# Altium footprint library WL_RFFC.PcbLib: 42 footprints (part 2 of 3)
Each footprint in its own frame and in the unit in brackets; x right, y up, seen from the top. Pads: shape width x height; smd on the part's side, far side on the other; paste and mask are expansions set on the pad; w line width, h text height; cw(c..) or ccw(c..) is an arc to the next point about the centre after c.
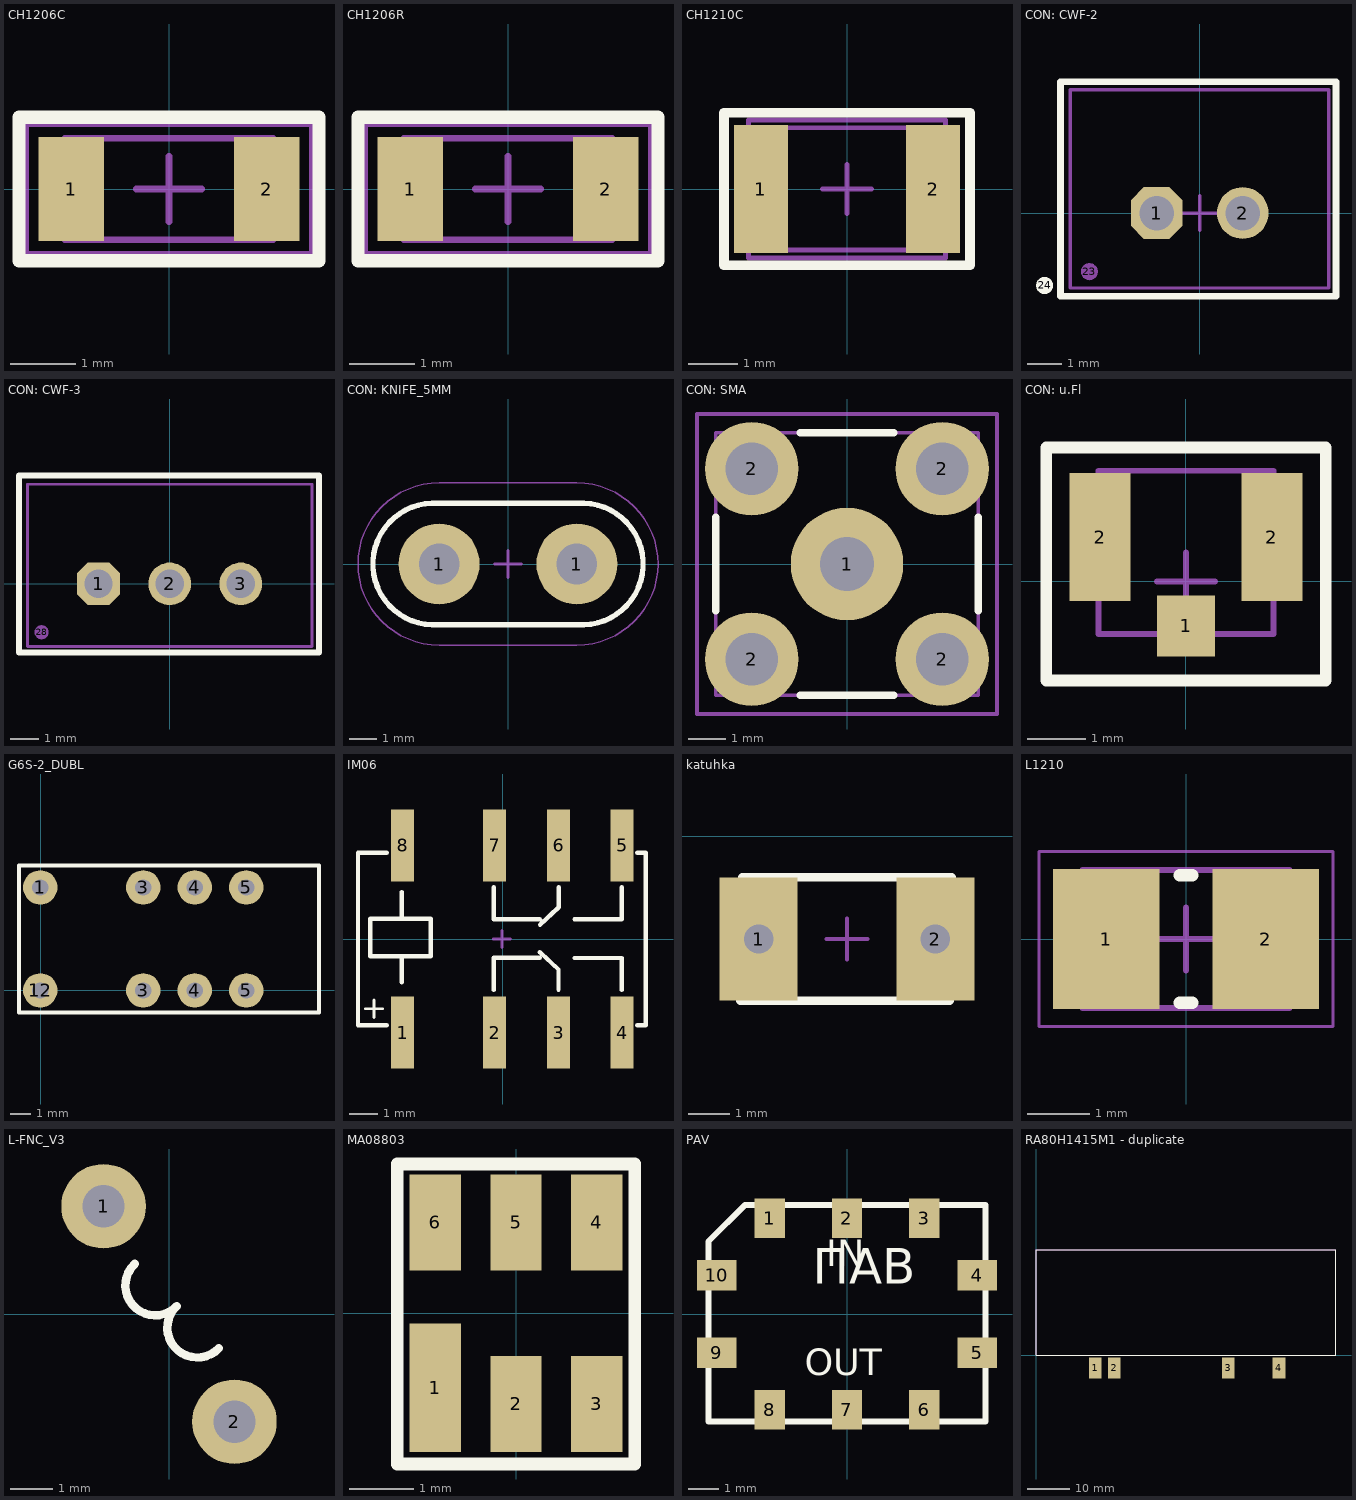
[diagram p1: the footprints below, top view; thin cyan lines are the x and y axes]

## CH1206C [mm] "Non polar chip capacitor, size 1206"
height 0.6
pads (2):
  rect 1x1.6 smd: 1(-1.5,0) 2(1.5,0)
Top Overlay:
  lines w0.2: -2.3,-1.1 -2.3,1.1 2.3,1.1 2.3,-1.1 -2.3,-1.1
Mechanical 1:
  lines w0.1: -1.6,-0.775 -1.6,0.775 1.6,0.775 1.6,-0.775 -1.6,-0.775
Mechanical 15:
  lines w0.1: -0.5,0 0.5,0 ; 0,-0.5 0,0.5 ; -2.2,-1 2.2,-1 2.2,1 -2.2,1 -2.2,-1
3D body "SW3dPS-1206 SMD Capacitor.STEP": height 1, standoff 0, extent -1.6,-0.8 1.6,0.8

## CH1206R [mm] "Chip Resistor, 2-Leads, Body 3,0x1,5mm, IPC Low Density"
height 0.6
pads (2):
  rect 1x1.6 smd: 1(-1.5,0) 2(1.5,0)
Top Overlay:
  lines w0.2: -2.3,-1.1 -2.3,1.1 2.3,1.1 2.3,-1.1 -2.3,-1.1
Mechanical 1:
  lines w0.1: -1.6,-0.775 -1.6,0.775 1.6,0.775 1.6,-0.775 -1.6,-0.775
Mechanical 15:
  lines w0.1: -0.5,0 0.5,0 ; 0,-0.5 0,0.5 ; -2.2,-1 2.2,-1 2.2,1 -2.2,1 -2.2,-1
3D body "chip_1206_r.STEP": height 0.47, standoff -0.03, extent -1.65,-0.8 1.55,0.8

## CH1210C [mm] "Non polar chip capacitor, size 1210"
height 2.5
pads (2):
  rect 1.1x2.6 smd: 1(-1.75,0) 2(1.75,0)
Top Overlay:
  lines w0.2: -2.5,-1.55 -2.5,1.55 2.5,1.55 2.5,-1.55 -2.5,-1.55
Mechanical 1:
  lines w0.1: -2,-1.244 2,-1.244 2,1.245 -2,1.245 -2,-1.244
Mechanical 15:
  lines w0.1: -0.5,0 0.5,0 ; 0,-0.5 0,0.5 ; -2,-1.4 -2,1.4 2,1.4 2,-1.4 -2,-1.4
3D body "User Library-1210(3225M) Cap.STEP": height 1.7, standoff 0, extent -2,-1.244 2,1.245

## CON: CWF-2 [mm]
height 7.7
pads (4):
  oct 1.5x1.5 hole 1: 1(-1.25,0)
  round 1.5 hole 1: 2(1.25,0)
  round 0.5 on Mech1: 23(-3.2,-1.7)
  round 0.5 on Top Overlay: 24(-4.5,-2.1)
Top Overlay:
  lines w0.2: -4.044,-2.413 -4.044,3.81 3.957,3.81 3.957,-2.413 -4.044,-2.413
Mechanical 1:
  lines w0.1: -3.75,-2.175 3.75,-2.175 3.75,3.575 -3.75,3.575 -3.75,-2.175
Mechanical 15:
  lines w0.1: -0.5,0 0.5,0 ; 0,-0.5 0,0.5 ; -4.044,-2.413 -4.044,3.81 3.957,3.81 3.957,-2.413 -4.044,-2.413
3D body "CWF-2.step": height 7, standoff -3.5, extent -3.75,-2.175 3.75,3.575

## CON: CWF-3 [mm]
height 7.7
pads (4):
  oct 1.5x1.5 hole 1: 1(-2.5,0)
  round 1.5 hole 1: 2(0,0) 3(2.5,0)
  round 0.5 on Mech1: 28(-4.5,-1.7)
Top Overlay:
  lines w0.2: -5.294,-2.413 5.247,-2.413 5.247,3.81 -5.294,3.81 -5.294,-2.413
Mechanical 1:
  lines w0.1: -5,-2.2 -5,3.5 5,3.5 5,-2.2 -5,-2.2
Mechanical 15:
  lines w0.1: -0.5,0 0.5,0 ; 0,-0.5 0,0.5 ; -5.294,-2.413 5.247,-2.413 5.247,3.81 -5.294,3.81 -5.294,-2.413
3D body "CWF-3.step": height 7, standoff -3.5, extent -5,-2.2 5,3.55

## CON: KNIFE_5MM [mm]
pads (2):
  round 3 hole 1.5: 1(-2.55,0) 1(2.55,0)
Top Overlay:
  lines w0.2: -2.8,-2.25 cw(c-2.749,0) -2.8,2.25 2.8,2.25 cw(c2.749,0) 2.8,-2.25 -2.8,-2.25
Mechanical 13:
  lines w0.05: -2.55,-3 cw(c-2.55,0) -2.55,3 2.55,3 cw(c2.55,0) 2.55,-3 -2.55,-3
Mechanical 15:
  lines w0.05: -2.55,-3 cw(c-2.55,0) -2.55,3 2.55,3 cw(c2.55,0) 2.55,-3 -2.55,-3
  lines w0.1: -0.5,0 0.5,0 ; 0,-0.5 0,0.5
3D body "TA-M.STEP": height 10.2, standoff -3.7, extent -3.975,-0.375 3.925,0.425

## CON: SMA [mm]
pads (5):
  round 3 hole 1.45: 1(0,0)
  round 2.5 hole 1.4: 2(-2.54,-2.54) 2(-2.54,2.54) 2(2.54,-2.54) 2(2.54,2.54)
Top Overlay:
  lines w0.2: -3.5,-1.25 -3.5,1.25 ; -1.25,-3.5 1.25,-3.5 ; -1.25,3.5 1.25,3.5 ; 3.5,-1.25 3.5,1.25
Mechanical 1:
  lines w0.1: -3.5,-3.5 3.5,-3.5 3.5,3.5 -3.5,3.5 -3.5,-3.5
Mechanical 15:
  lines w0.1: -0.5,0 0.5,0 ; 0,-0.5 0,0.5 ; -4,-4 -4,4 4,4 4,-4 -4,-4
3D body "SMA_connector.STEP": height 9.53, standoff -3.94, extent -3.5,-3.5 3.5,3.5

## CON: u.Fl [mm]
height 1.5
pads (3):
  rect 1x1.05 smd: 1(0,-0.763)
  rect 1.05x2.2 smd: 2(-1.475,0.763) 2(1.475,0.763)
Top Overlay:
  lines w0.2: -2.4,-1.7 2.4,-1.7 2.4,2.3 -2.4,2.3 -2.4,-1.7
Mechanical 1:
  lines w0.1: -1.5,-0.9 1.5,-0.9 1.5,1.9 -1.5,1.9 -1.5,-0.9
Mechanical 15:
  lines w0.1: -0.5,0 0.5,0 ; 0,-0.5 0,0.5 ; -2.4,-1.7 -2.4,2.3 2.4,2.3 2.4,-1.7 -2.4,-1.7
3D body "IPX.step": height 1.27, standoff -0.01, extent -1.5,-0.95 1.5,1.9

## G6S-2_DUBL [mm]
pads (8):
  round 1.7 hole 0.8: 1(-0.025,5.08) 3(5.055,0) 3(5.055,5.08) 4(7.595,0) 4(7.595,5.08) 5(10.135,0) 5(10.135,5.08) 12(-0.025,0)
Top Overlay:
  lines w0.2: -1.075,2.534 -1.075,-1.096 13.725,-1.096 13.725,6.17 -1.075,6.17 -1.075,2.54
3D body "User Library-Relays-G6S-2.STEP": height 8.55, standoff -2.95, extent -1.175,-1.125 13.625,6.175

## IM06 [mm]
pads (8):
  rect 0.8x2.5 smd: 1(-3.475,-3.25) 2(-0.275,-3.25) 3(1.95,-3.25) 4(4.15,-3.25) 5(4.15,3.25) 6(1.95,3.25) 7(-0.275,3.25) 8(-3.475,3.25)
Top Overlay:
  lines w0.1: -4.775,-2.425 -4.175,-2.425 ; -4.475,-2.725 -4.475,-2.125
  lines w0.15: -4.025,-3 -5.025,-3 -5.025,3 -4.025,3 ; -3.505,-1.5 -3.505,-0.65 ; -3.505,0.782 -3.505,1.632 ; -0.308,-1.774 -0.308,-0.656 1.295,-0.656 ; -0.308,1.8 -0.308,0.682 1.295,0.682 ; 1.295,-0.459 1.945,-1.059 1.945,-1.759 ; 1.3,0.5 1.95,1.1 1.95,1.8 ; 2.5,-0.657 4.14,-0.657 4.14,-1.775 ; 2.5,0.681 4.14,0.681 4.14,1.799 ; 4.675,-3 4.975,-3 4.975,3 4.675,3 ; -4.6,-0.6 -2.5,-0.6 -2.5,0.7 -4.6,0.7 -4.6,-0.6
Mechanical 3:
  lines w0.1: -0.325,0 0.275,0 ; -0.025,-0.3 -0.025,0.3
3D body "User Library-AXICOM IMxxGR-1.SLDPRT": height 5.7, standoff 0.03, extent -4.675,-3.725 5.325,3.775

## katuhka [mm]
pads (2):
  rect 1.9x3 smd: 1(5.35,-2.5) 2(9.65,-2.5)
via 9.65,-2.5 diameter 1.27 hole 0.711
via 5.35,-2.5 diameter 1.27 hole 0.711
Top Overlay:
  lines w0.2: 4.9,-4 10,-4 ; 4.95,-1 10.05,-1
Mechanical 1:
  lines w0.1: 4.95,-4 4.95,-1 10.05,-1 10.05,-4 4.95,-4
Mechanical 15:
  lines w0.1: 7,-2.5 8,-2.5 ; 7.5,-3 7.5,-2
3D body "User Library-D=0,45x3,5x4.STEP": height 5.8, standoff -0.49, extent 5.781,-6.027 9.062,0.254

## L1210 [mm]
height 0.65
pads (2):
  rect 1.7x2.24 smd: 1(-1.275,0) 2(1.275,0)
Top Overlay:
  lines w0.2: -0.1,-1.02 0.1,-1.02 ; -0.1,1.02 0.1,1.02
Mechanical 13:
  lines w0.1: -1.65,-1.1 -1.65,1.1 1.65,1.1 1.65,-1.1 -1.65,-1.1
Mechanical 15:
  lines w0.05: -2.35,-1.4 -2.35,1.4 2.35,1.4 2.35,-1.4 -2.35,-1.4
  lines w0.1: -0.5,0 0.5,0 ; 0,-0.5 0,0.5
3D body "User Library-3225.STEP": height 1.9, standoff 0, extent -1.625,-1.25 1.575,1.25

## L-FNC_V3 [mm]
pads (2):
  round 2 hole 1: 1(-1.55,2.55) 2(1.55,-2.55)
Top Overlay:
  lines w0.2: -0.815,1.185 ccw(c-0.325,0.675) 0.185,0.185 ; 0.178,0.188 ccw(c0.668,-0.322) 1.178,-0.812
3D body "3X5-0.8.STEP": height 5.9, standoff -1.5, extent -1.85,-2.85 1.95,2.95

## MA08803 [mm]
pads (6):
  rect 0.8x2 smd: 1(-1.261,-1.164)
  rect 0.8x1.5 smd: 2(0,-1.414) 3(1.261,-1.414) 4(1.261,1.413) 5(0,1.414) 6(-1.261,1.413)
Top Overlay:
  lines w0.2: -1.85,-2.35 -1.85,2.325 1.85,2.325 1.85,-2.35 -1.85,-2.35

## PAV [mm]
pads (10):
  rect 1x1.3 smd: 1(-2.54,3.15) 2(0,3.15) 3(2.54,3.15) 6(2.54,-3.15) 7(0,-3.15) 8(-2.54,-3.15)
  rect 1.3x1 smd: 4(4.275,1.27) 5(4.275,-1.27) 9(-4.275,-1.27) 10(-4.275,1.27)
Top Overlay:
  lines w0.2: -4.55,-3.525 -4.55,2.38 -3.355,3.575 4.55,3.575 4.55,-3.525 -4.55,-3.525
  text "OUT" at -1.385,-2.3 h1.5
  text "IN" at -0.68,1.27 h1.5
  text "ПАВ" at -1.125,0.6 h2
3D body "PAV145M.STEP": height 1.6, standoff -0.02, extent -4.55,-3.525 4.55,3.575

## RA80H1415M1 - duplicate [mm]
pads (4):
  rect 3x5 smd: 1(14,-3) 2(18.5,-3) 3(45.5,-3) 4(57.5,-3)
Top Overlay:
  lines w0.2: 0,0 0,25 71,25 71,0 0,0
Mechanical 15:
  lines w0.2: 0,0 71,0 71,25 0,25 0,0